# Altium footprint library hallglib.PcbLib: 83 footprints (part 1 of 6)
Each footprint in its own frame and in the unit in brackets; x right, y up, seen from the top. Pads: shape width x height; smd on the part's side, far side on the other; paste and mask are expansions set on the pad; w line width, h text height; cw(c..) or ccw(c..) is an arc to the next point about the centre after c.
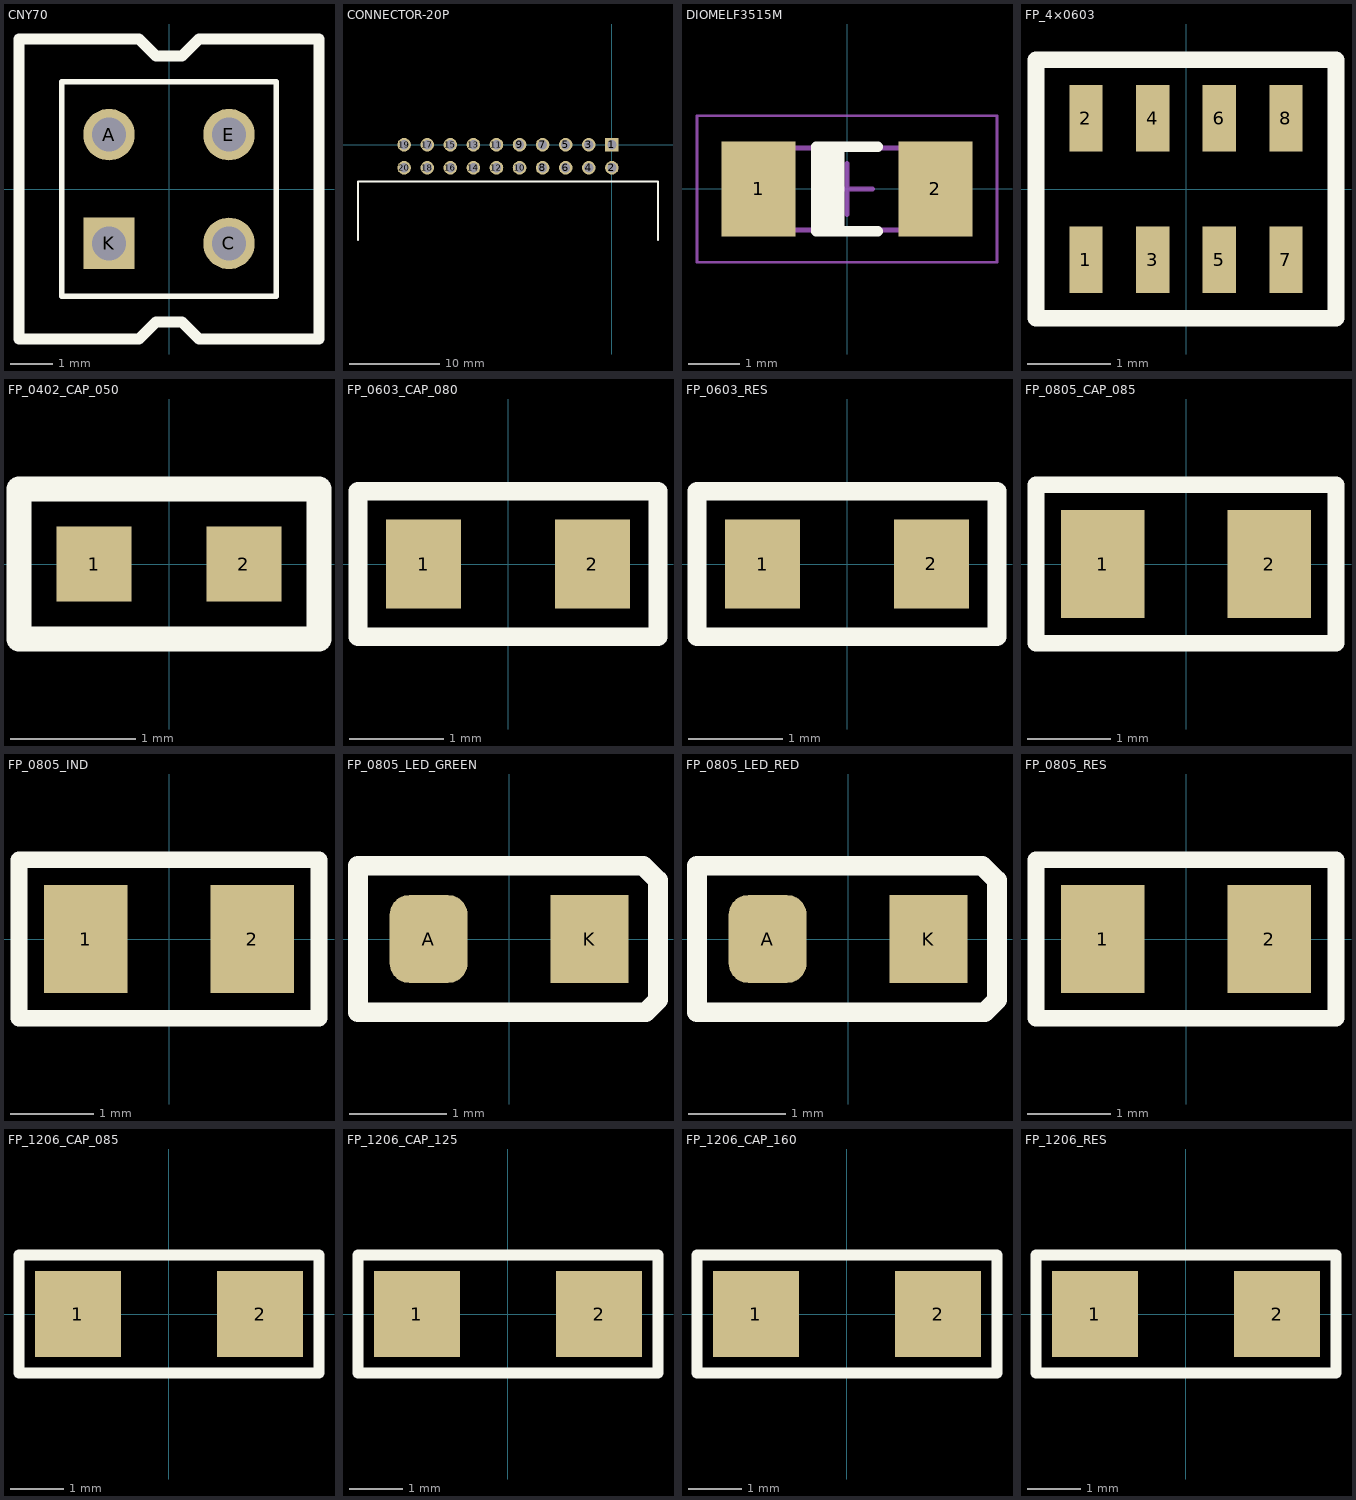
[diagram p0: the footprints below, top view; thin cyan lines are the x and y axes]

## CNY70 [mm]
height 6
pads (4):
  round 1.2 hole 0.8: A(-1.4,1.27) C(1.4,-1.27) E(1.4,1.27)
  rect 1.2x1.2 hole 0.8: K(-1.4,-1.27)
Top Overlay:
  lines w0.127: -2.5,-2.5 -2.5,2.5 2.5,2.5 2.5,-2.5 -2.5,-2.5
  lines w0.254: -3.5,-3.5 -0.7,-3.5 -0.3,-3.1 0.3,-3.1 0.7,-3.5 3.5,-3.5 3.5,3.5 0.7,3.5 0.3,3.1 -0.3,3.1 -0.7,3.5 -3.5,3.5 -3.5,-3.5
3D body "SW3dPS-cny70-1.STEP": height 6.02, standoff -5.73, extent -3.5,-3.5 3.5,3.5

## CONNECTOR-20P [mm] "Right angle ribbon cable connector"
height 8.95
pads (20):
  rect 1.5x1.5 hole 1: 1(0,0)
  round 1.5 hole 1: 2(0,-2.54) 3(-2.54,0) 4(-2.54,-2.54) 5(-5.08,0) 6(-5.08,-2.54) 7(-7.62,0) 8(-7.62,-2.54) 9(-10.16,0) 10(-10.16,-2.54) 11(-12.7,0) 12(-12.7,-2.54) 13(-15.24,0) 14(-15.24,-2.54) 15(-17.78,0) 16(-17.78,-2.54) 17(-20.32,0) 18(-20.32,-2.54) 19(-22.86,0) 20(-22.86,-2.54)
Top Overlay:
  lines w0.2: -27.94,-10.5 -27.94,-4.064 5.08,-4.064 5.08,-10.5
3D body: height 8.95, standoff 0, extent -28.04,-13.3 5.18,-3.964

## DIOMELF3515M [mm] "MELF Diode, 2-Leads, Body 3,50x1,50mm, IPC Low Density"
height 1.6
pads (2):
  rect 1.45x1.85 smd: 1(-1.725,0) 2(1.725,0)
Top Overlay:
  rectangle: -0.6,-0.825 -0.05,0.825
  lines w0.2: 0.6,-0.825 -0.6,-0.825 -0.6,0.825 0.6,0.825
Mechanical 13:
  lines w0.1: -1.8,-0.8 -1.8,0.8 1.8,0.8 1.8,-0.8 -1.8,-0.8
Mechanical 15:
  lines w0.05: -2.925,-1.425 -2.925,1.425 2.925,1.425 2.925,-1.425 -2.925,-1.425
  lines w0.1: -0.5,0 0.5,0 ; 0,-0.5 0,0.5
3D body "DIOMELF3515M.step": height 1.5, standoff 0.01, extent -1.75,-0.749 1.75,0.749

## FP_4×0603 [mm] "4×0603-as ellenállásháló"
pads (8):
  rect 0.4x0.8 smd: 1(-1.2,-0.85) 2(-1.2,0.85) 3(-0.4,-0.85) 4(-0.4,0.85) 5(0.4,-0.85) 6(0.4,0.85) 7(1.2,-0.85) 8(1.2,0.85)
Top Overlay:
  lines w0.2: -1.8,-1.55 -1.8,1.55 1.8,1.55 1.8,-1.55 -1.8,-1.55
3D body "RN164P.STEP": height 0.55, standoff 0, extent -1.6,-0.8 1.6,0.8

## FP_0402_CAP_050 [mm] "0.5mm magas 0402 kapacitás"
height 0.55
pads (2):
  rect 0.6x0.6 smd: 1(-0.6,0) 2(0.6,0)
Top Overlay:
  lines w0.2: -1.2,-0.6 1.2,-0.6 1.2,0.6 -1.2,0.6 -1.2,-0.6
3D body: height 0.5, standoff 0, extent -0.5,-0.25 -0.3,0.25
3D body: height 0.5, standoff 0, extent 0.3,-0.25 0.5,0.25
3D body: height 0.5, standoff 0, extent -0.3,-0.25 0.3,0.25

## FP_0603_CAP_080 [mm] "0.8mm magas 0603 kapacitás"
height 0.9
pads (2):
  rect 0.8x0.95 smd: 1(-0.9,0) 2(0.9,0)
Top Overlay:
  lines w0.2: 1.225,-0.775 -1.225,-0.775 ; -1.225,-0.775 1.6,-0.775 1.6,0.775 1.225,0.775 -1.225,0.775 -1.6,0.775 -1.6,-0.775 -1.225,-0.775
3D body: height 0.8, standoff 0, extent -0.8,-0.4 -0.5,0.4
3D body: height 0.8, standoff 0, extent 0.5,-0.4 0.762,0.4
3D body: height 0.8, standoff 0, extent -0.5,-0.4 0.5,0.4

## FP_0603_RES [mm] "0603 ellenállás"
height 0.55
pads (2):
  rect 0.8x0.95 smd: 1(-0.9,0) 2(0.9,0)
Top Overlay:
  lines w0.2: -1.6,-0.775 -1.6,0.775 -1.225,0.775 1.225,0.775 1.6,0.775 1.6,-0.775 1.225,-0.775 -1.225,-0.775 -1.6,-0.775
3D body "0603RES.STEP": height 0.44, standoff -0.01, extent -0.8,-0.4 0.8,0.4

## FP_0805_CAP_085 [mm] "0805 kapacitás YAGEO 0.85mm magas"
height 0.86
pads (2):
  rect 1x1.3 smd: 1(-1,0) 2(1,0)
Top Overlay:
  lines w0.2: -1.8,-0.95 -1.8,0.95 1.8,0.95 1.8,-0.95 -1.8,-0.95
3D body: height 0.85, standoff 0, extent -0.644,-0.635 0.676,0.635
3D body: height 0.85, standoff 0, extent 0.676,-0.635 1.032,0.635
3D body: height 0.85, standoff 0, extent -1,-0.635 -0.644,0.635

## FP_0805_IND [mm] "0805 power inductor"
height 1.45
pads (2):
  rect 1x1.3 smd: 1(-1,0) 2(1,0)
Top Overlay:
  lines w0.2: -1.8,-0.95 -1.8,0.95 1.8,0.95 1.8,-0.95 -1.8,-0.95
3D body: height 1.25, standoff 0, extent -0.644,-0.635 0.676,0.635
3D body: height 1.25, standoff 0, extent 0.676,-0.635 1.032,0.635
3D body: height 1.25, standoff 0, extent -1,-0.635 -0.644,0.635

## FP_0805_LED_GREEN [mm] "0805 méretű zöld LED"
height 1
pads (2):
  rrect50% 0.8x0.9 smd: A(-0.825,0)
  rect 0.8x0.9 smd: K(0.825,0)
Top Overlay:
  lines w0.2: -1.549,-0.75 1.4,-0.75 1.525,-0.625 1.525,0.6 1.375,0.75 -1.549,0.75 -1.549,-0.22 -1.549,-0.75
3D body "led_0805_green.step": height 1.1, standoff 0, extent -1.01,-0.625 1.01,0.625

## FP_0805_LED_RED [mm] "0805 méretű piros LED"
height 1
pads (2):
  rrect50% 0.8x0.9 smd: A(-0.825,0)
  rect 0.8x0.9 smd: K(0.825,0)
Top Overlay:
  lines w0.2: -1.549,-0.75 1.4,-0.75 1.525,-0.625 1.525,0.6 1.375,0.75 -1.549,0.75 -1.549,-0.22 -1.549,-0.75
3D body "led_0805r.STEP": height 1.1, standoff 0, extent -1,-0.625 1.02,0.625

## FP_0805_RES [mm] "0805 ellenállás"
height 0.5
pads (2):
  rect 1x1.3 smd: 1(-1,0) 2(1,0)
Top Overlay:
  lines w0.2: -1.8,-0.95 -1.8,0.95 1.8,0.95 1.8,-0.95 -1.8,-0.95
3D body "0805RES.STEP": height 0.62, standoff 0.02, extent -1,-0.625 1,0.625

## FP_1206_CAP_085 [mm] "1206 kapacitás 0.85 mm"
height 0.86
pads (2):
  rect 1.6x1.6 smd: 1(-1.7,0) 2(1.7,0)
Top Overlay:
  lines w0.2: -2.8,-1.1 2.8,-1.1 2.8,1.1 -2.8,1.1 -2.8,-1.1
3D body: height 0.85, standoff 0, extent -1.065,-0.787 1.119,0.787
3D body: height 0.85, standoff 0, extent 1.119,-0.787 1.577,0.787
3D body: height 0.85, standoff 0, extent -1.522,-0.787 -1.065,0.787

## FP_1206_CAP_125 [mm] "1206 kapacitás 1.25 mm"
height 1.27
pads (2):
  rect 1.6x1.6 smd: 1(-1.7,0) 2(1.7,0)
Top Overlay:
  lines w0.2: -2.8,-1.1 -2.8,1.1 2.8,1.1 2.8,-1.1 -2.8,-1.1
3D body: height 1.25, standoff 0, extent -1.522,-0.787 -1.065,0.787
3D body: height 1.25, standoff 0, extent 1.119,-0.787 1.577,0.787
3D body: height 1.25, standoff 0, extent -1.065,-0.787 1.119,0.787

## FP_1206_CAP_160 [mm] "1206 kapacitás 1.6mm magas"
height 1.62
pads (2):
  rect 1.6x1.6 smd: 1(-1.7,0) 2(1.7,0)
Top Overlay:
  lines w0.2: -2.8,-1.1 2.8,-1.1 2.8,1.1 -2.8,1.1 -2.8,-1.1
3D body: height 1.6, standoff 0, extent -1.065,-0.787 1.119,0.787
3D body: height 1.6, standoff 0, extent 1.119,-0.787 1.577,0.787
3D body: height 1.6, standoff 0, extent -1.522,-0.787 -1.065,0.787

## FP_1206_RES [mm] "1206 ellenállás"
height 0.5
pads (2):
  rect 1.6x1.6 smd: 1(-1.7,0) 2(1.7,0)
Top Overlay:
  lines w0.2: -2.8,-1.1 -2.8,1.1 2.8,1.1 2.8,-1.1 -2.8,-1.1
3D body "1206RES.STEP": height 0.62, standoff 0.02, extent -1.6,-0.8 1.6,0.8